# Altium footprint library XTIDA-010086.PcbLib: 88 footprints (part 5 of 6)
Each footprint in its own frame and in the unit in brackets; x right, y up, seen from the top. Pads: shape width x height; smd on the part's side, far side on the other; paste and mask are expansions set on the pad; w line width, h text height; cw(c..) or ccw(c..) is an arc to the next point about the centre after c.
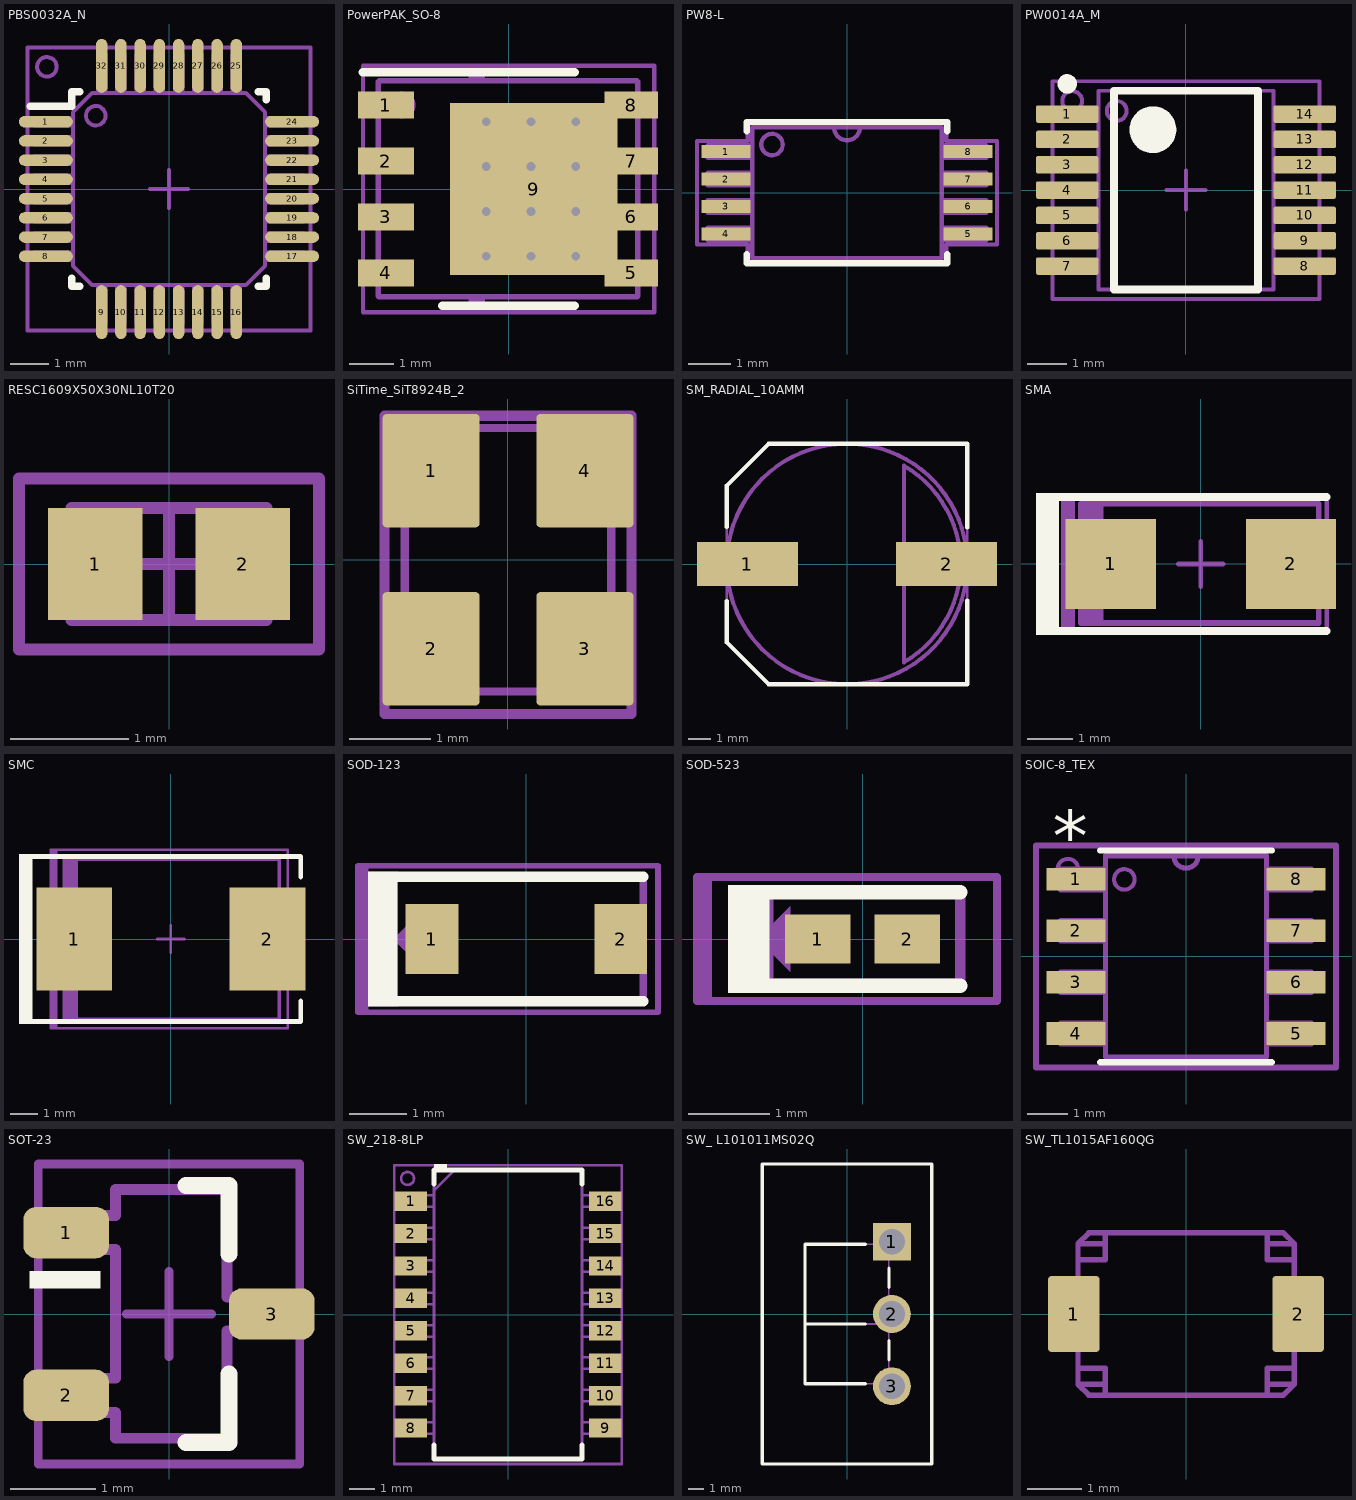
[diagram p4: the footprints below, top view; thin cyan lines are the x and y axes]

## PBS0032A_N [mm]
height 1.2
pads (32):
  oval 1.4x0.3 smd: 1(-3.2,1.75) 2(-3.2,1.25) 3(-3.2,0.75) 4(-3.2,0.25) 5(-3.2,-0.25) 6(-3.2,-0.75) 7(-3.2,-1.25) 8(-3.2,-1.75) 17(3.2,-1.75) 18(3.2,-1.25) 19(3.2,-0.75) 20(3.2,-0.25) 21(3.2,0.25) 22(3.2,0.75) 23(3.2,1.25) 24(3.2,1.75)
  oval 0.3x1.4 smd: 9(-1.75,-3.2) 10(-1.25,-3.2) 11(-0.75,-3.2) 12(-0.25,-3.2) 13(0.25,-3.2) 14(0.75,-3.2) 15(1.25,-3.2) 16(1.75,-3.2) 25(1.75,3.2) 26(1.25,3.2) 27(0.75,3.2) 28(0.25,3.2) 29(-0.25,3.2) 30(-0.75,3.2) 31(-1.25,3.2) 32(-1.75,3.2)
Top Overlay:
  lines w0.2: -3.6,2.15 -2.527,2.15 -2.527,2.527 -2.327,2.527 ; -2.527,-2.327 -2.527,-2.527 -2.327,-2.527 ; 2.327,-2.527 2.527,-2.527 2.527,-2.327 ; 2.327,2.527 2.527,2.527 2.527,2.327
Mechanical 5:
  circle w0.102: c-3.175,3.175 r0.254
  lines w0.102: -3.683,-3.683 -3.683,3.683 3.683,3.683 3.683,-3.683 -3.683,-3.683
  text ".Designator" at -3.76,-0.238 h0.75
Mechanical 13:
  drawing of 417 lines, arcs and shapes, not listed
Mechanical 15:
  lines w0.1: -0.5,0 0.5,0 ; 0,-0.5 0,0.5
3D body "PBS0032A.stp": height 1.12, standoff 0.03, extent -3.5,-3.5 3.5,3.5

## PowerPAK_SO-8 [mil] "Vishay PowerPAK SO-8, Body 5.3x6.0mm (max), Pitch 1.27mm, IPC Medium Density"
height 44.09
pads (9):
  rect 50x24 smd mask+2.99: 1(-109.5,75) 2(-109.5,25) 3(-109.5,-25) 4(-109.5,-75)
  rect 48x24 smd mask+2.99: 5(109.5,-75) 8(109.5,75)
  rect 48x24 smd paste-12 mask+2.99: 6(109.5,-25) 7(109.5,25)
  rect 150x154 smd paste-75 mask+2.99: 9(22.5,0)
via 60,-60 diameter 19.68 hole 7.87
via 20,-60 diameter 19.68 hole 7.87
via -20,-60 diameter 19.68 hole 7.87
via 60,-20 diameter 19.68 hole 7.87
via 20,-20 diameter 19.68 hole 7.87
via -20,-20 diameter 19.68 hole 7.87
via 60,20 diameter 19.68 hole 7.87
via 20,20 diameter 19.68 hole 7.87
via -20,20 diameter 19.68 hole 7.87
via 60,60 diameter 19.68 hole 7.87
via 20,60 diameter 19.68 hole 7.87
via -20,60 diameter 19.68 hole 7.87
Top Overlay:
  lines w7.87: -129.92,104.33 59.06,104.33 ; -59.06,-104.33 59.06,-104.33
Top Paste:
  rectangle: 97.5,-37 133,-13
  rectangle: 97.5,13 133,37
  rectangle: 25,-72 92.5,-2.5
  rectangle: 25.5,2.5 93,72
  rectangle: -47,2.5 20.5,72
  rectangle: -47.5,-72 20,-2.5
Mechanical 5:
  circle w4: c-95,75 r10
  lines w3.94: -130,-110 130,-110 130,110 -130,110 -130,-110
  text ".Designator" at -148.02,-9.38 h29.53
Mechanical 13:
  circle w4: c-95,75 r10
  lines w5: -116.46,-95.39 -115.48,-96.38 -115.46,-96.38 -33.46,-96.38 ; -116.46,-95.39 -116.46,-95.38 ; -116.46,-95.38 -116.46,-80.88 ; -116.46,-80.88 -121.46,-80.88 -121.46,-68.88 -116.46,-68.88 ; -116.46,-80.88 -116.46,-68.88 ; -116.46,-68.88 -116.46,-30.88 ; -116.46,-30.88 -121.46,-30.88 -121.46,-18.88 -116.46,-18.88 ; -116.46,-30.88 -116.46,-18.88 ; -116.46,-18.88 -116.46,19.12 ; -116.46,19.12 -116.46,31.12 ; -116.46,19.12 -121.46,19.12 -121.46,31.12 -116.46,31.12 ; -116.46,31.12 -116.46,69.12 ; -116.46,69.12 -121.46,69.12 -121.46,81.12 -116.46,81.12 ; -116.46,69.12 -116.46,81.12 ; -116.46,81.12 -116.46,95.62 -116.46,95.64 -115.48,96.62 -115.46,96.62 -33.46,96.62 ; -33.46,-96.38 -23.46,-96.38 ; -33.46,-96.38 -33.46,-101.38 -23.46,-101.38 -23.46,-96.38 ; -33.46,96.62 -23.46,96.62 ; -33.46,96.62 -33.46,101.62 -23.46,101.62 -23.46,96.62 ; -23.46,-96.38 114.54,-96.38 ; -23.46,96.62 114.54,96.62 ; 114.55,-96.38 115.54,-95.39 ; 114.54,-96.38 114.55,-96.38 ; 114.54,96.62 114.55,96.62 ; 114.55,96.62 115.54,95.64 115.54,95.62 115.54,81.12 ; 115.54,-95.38 115.54,-80.88 ; 115.54,-95.39 115.54,-95.38 ; 115.54,-80.88 115.54,-68.88 ; 115.54,-80.88 120.54,-80.88 120.54,-68.88 115.54,-68.88 ; 115.54,-68.88 115.54,-30.88 ; 115.54,-30.88 120.54,-30.88 120.54,-18.88 115.54,-18.88 ; 115.54,-30.88 115.54,-18.88 ; 115.54,-18.88 115.54,19.12 ; 115.54,19.12 115.54,31.12 ; 115.54,19.12 120.54,19.12 120.54,31.12 115.54,31.12 ; 115.54,31.12 115.54,69.12 ; 115.54,69.12 115.54,81.12 ; 115.54,69.12 120.54,69.12 120.54,81.12 115.54,81.12
Mechanical 15:
  lines w3.94: -19.68,0 19.68,0 ; 0,-19.68 0,19.68
3D body "PPAKSO8-SINGLE.stp": height 42.6, standoff 0.6, extent -120.84,-101.5 121.16,101.5

## PW8-L [mil]
pads (8):
  rect 46x12 smd paste+0 mask+0: 1(-113,38.39) 2(-113,12.8) 3(-113,-12.8) 4(-113,-38.39) 5(113,-38.39) 6(113,-12.8) 7(113,12.8) 8(113,38.39)
Top Overlay:
  lines w6: -93.5,-57.49 -93.5,-66 93.5,-66 93.5,-57.49 ; -93.5,57.49 -93.5,66 93.5,66 93.5,57.49
  text "." at -120,75 h50
Mechanical 5:
  circle w4: c-70,45 r10
  lines w4: -140,-48.39 -92.5,-48.39 -92.5,-65 92.5,-65 92.5,-48.39 140,-48.39 140,48.39 92.5,48.39 92.5,65 -92.5,65 -92.5,48.39 -140,48.39 -140,-48.39
  text ".Designator" at -118.5,-7.41 h23.62
Mechanical 13:
  circle w4: c-70,45 r10
  lines w4: -12,61 ccw(c0,61) 12,61 ; -130,-44.39 -88.5,-44.39 -88.5,-32.39 -130,-32.39 -130,-44.39 ; -130,-18.8 -130,-6.8 -88.5,-6.8 -88.5,-18.8 -130,-18.8 ; -130,6.8 -88.5,6.8 -88.5,18.8 -130,18.8 -130,6.8 ; -130,32.39 -88.5,32.39 -88.5,44.39 -130,44.39 -130,32.39 ; -88.5,-61 88.5,-61 88.5,61 -88.5,61 -88.5,-61 ; 88.5,-44.39 130,-44.39 130,-32.39 88.5,-32.39 88.5,-44.39 ; 88.5,-18.8 130,-18.8 130,-6.8 88.5,-6.8 88.5,-18.8 ; 88.5,6.8 130,6.8 130,18.8 88.5,18.8 88.5,6.8 ; 88.5,32.39 130,32.39 130,44.39 88.5,44.39 88.5,32.39
3D body "PW0008A.stp": height 42.32, standoff -0.98, extent -126.39,-59.05 126.4,59.06

## PW0014A_M [mm] "SOP, 14-Leads, Body 5.1x4.5mm, Pitch 0.65mm, IPC Low Density"
height 1.2
pads (14):
  rrect22% 1.6x0.45 smd: 1(-3.05,1.95) 2(-3.05,1.3) 3(-3.05,0.65) 4(-3.05,0) 5(-3.05,-0.65) 6(-3.05,-1.3) 7(-3.05,-1.95) 8(3.05,-1.95) 9(3.05,-1.3) 10(3.05,-0.65) 11(3.05,0) 12(3.05,0.65) 13(3.05,1.3) 14(3.05,1.95)
Top Overlay:
  circle w0.6: c-0.85,1.55 r0.3
  circle w0.25: c-3.05,2.725 r0.125
  lines w0.2: -1.85,-2.55 1.85,-2.55 1.85,2.55 -1.85,2.55 -1.85,-2.55
Mechanical 5:
  circle w0.102: c-2.921,2.286 r0.254
  lines w0.102: -3.429,-2.794 3.429,-2.794 3.429,2.794 -3.429,2.794 -3.429,-2.794
  text ".Designator" at -3.76,-0.238 h0.75
Mechanical 13:
  circle w0.102: c-1.778,2.032 r0.254
  lines w0.1: -2.25,-2.55 2.25,-2.55 2.25,2.55 -2.25,2.55 -2.25,-2.55
Mechanical 15:
  lines w0.1: -0.5,0 0.5,0 ; 0,-0.5 0,0.5
3D body "PW0014AakaMTC14.stp": height 1, standoff 0, extent -3.21,-2.5 3.21,2.5

## RESC1609X50X30NL10T20 [mm] "Chip Resistor, 2-Leads, Body 1.55x0.85mm, IPC Medium Density"
height 0.5
pads (2):
  rect 0.8x0.95 smd: 1(-0.625,0) 2(0.625,0)
Mechanical 5:
  lines w0.1: -1.27,-0.725 -1.27,0.725 1.27,0.725 1.27,-0.725 -1.27,-0.725
  text ".Designator" at -2.249,-0.15 h0.45
Mechanical 13:
  lines w0.1: -0.825,-0.475 0.825,-0.475 0.825,0.475 -0.825,0.475 -0.825,-0.475
Mechanical 15:
  lines w0.1: -0.475,0 0.475,0 ; 0,-0.475 0,0.475
3D body: height 0.5, standoff 0, extent -0.525,-0.475 0.525,0.475
3D body: height 0.5, standoff 0, extent 0.525,-0.475 0.825,0.475
3D body: height 0.5, standoff 0, extent -0.825,-0.475 -0.525,0.475

## SiTime_SiT8924B_2 [mm] "SMD, 4-Leads, Body 3.2x2.5mm"
height 0.8
pads (4):
  rrect8% 1.2x1.4 smd: 1(-0.95,1.1) 2(-0.95,-1.1) 3(0.95,-1.1) 4(0.95,1.1)
Mechanical 5:
  circle w0.1: c-0.7,1 r0.224
  lines w0.127: -1.524,-1.905 1.524,-1.905 1.524,1.778 -1.524,1.778 -1.524,-1.905
  text ".Designator" at -2.249,-0.15 h0.45
Mechanical 13:
  lines w0.1: -1.275,-1.625 -1.275,1.625 1.275,1.625 1.275,-1.625 -1.275,-1.625
3D body: height 0.8, standoff 0.8, extent -0.923,0.777 -0.477,1.223
3D body: height 0.8, standoff 0, extent -1.274,-1.624 1.274,1.624

## SM_RADIAL_10AMM [mm] "10 x 7.9mm:  Sanyo Oscon F8"
height 8
pads (2):
  rect 4.4x1.9 smd: 1(-4.35,0) 2(4.35,0)
Top Overlay:
  lines w0.178: -5.25,-1.624 -5.25,-3.425 -3.425,-5.25 5.25,-5.25 5.25,-1.597 ; -5.25,1.624 -5.25,3.425 -3.425,5.25 5.25,5.25 5.25,1.597
Mechanical 5:
  lines w0.127: -5.25,-3.425 -3.425,-5.25 5.25,-5.25 5.25,-1.597 5.25,1.597 5.25,5.25 -3.425,5.25 -5.25,3.425 -5.25,1.624 -5.25,-1.624 -5.25,-3.425
  text ".Designator" at -4.998,-0.333 h1
Mechanical 13:
  circle w0.178: c0,0 r5.25
  lines w0.178: 2.48,-4.296 ccw(c0,0) 2.48,4.296 2.48,-4.296
3D body: height 1, standoff 0, extent -5.251,-5.251 5.251,5.251
3D body: height 8, standoff 1, extent -5.249,-5.249 5.249,5.249
3D body: height 8, standoff 8, extent 2.48,-4.296 4.961,4.296

## SMA [mm] "Molded Diode, 2-Leads, Body 4.3x2.6mm, IPC Medium Density, based on OnSemi component dimensions and land pattern"
height 2.27
pads (2):
  rect 2x2 smd: 1(-2,0) 2(2,0)
Top Overlay:
  rectangle: -3.658,-1.575 -3.15,1.575
  lines w0.178: -3.327,-1.486 2.794,-1.486 ; -3.327,1.486 2.794,1.486
Mechanical 5:
  rectangle: -3.048,-1.524 -2.794,1.524
  region: -2.286,-0.4 -2.286,0.4 -2.686,0
  lines w0.1: -3.048,-1.516 2.794,-1.516 2.794,1.524 -3.048,1.524 -3.048,-1.516
  text ".Designator" at -2.999,-0.2 h0.6
Mechanical 13:
  rectangle: -2.667,-1.335 -2.159,1.368
  lines w0.127: -2.667,-1.31 -2.667,1.338 2.617,1.338 2.617,-1.31 -2.667,-1.31
Mechanical 15:
  lines w0.1: -0.5,0 0.5,0 ; 0,-0.5 0,0.5
3D body "SMA_nominal.stp": height 2.42, standoff 0.02, extent -2.6,-1.3 2.6,1.3

## SMC [mil] "Molded Diode, 2-Leads, Body 6.9x5.8mm, IPC Medium Density, based on OnSemi component dimensions and land patterns"
height 94.88
pads (2):
  rect 110x150 smd: 1(-140.49,0) 2(140.49,0)
Top Overlay:
  rectangle: -221,-123.5 -201,123.5
  lines w7: -210,-120 189,-120 189,-90.25 ; -210,120 189,120 189,90.25
Mechanical 5:
  rectangle: -175,-129.92 -165,130
  region: -139.25,-15.92 -139.25,15.57 -155,-0.17
  lines w3.94: -175,-129.92 -175,129.92 170,129.92 170,-129.92 -175,-129.92
  text ".Designator" at -147.59,-9.84 h29.53
Mechanical 13:
  rectangle: -155,-116.52 -135,115
  lines w5: -155,-116.56 157.72,-116.56 157.72,116.17 -155,116.17 -155,-116.52
Mechanical 15:
  lines w3.94: -19.69,0 19.68,0 ; 0,-19.68 0,19.68
3D body "SMC_nominal.stp": height 91.35, standoff 0.6, extent -156.49,-116.13 156.5,116.15

## SOD-123 [mm] "On Semi recommended land pattern"
height 1.35
pads (2):
  rect 0.915x1.22 smd: 1(-1.637,0) 2(1.637,0)
Top Overlay:
  rectangle: -2.744,-1.168 -2.236,1.168
  lines w0.178: -2.413,-1.079 2.032,-1.079 ; -2.413,1.079 2.032,1.079
Mechanical 5:
  rectangle: -2.921,-1.27 -2.737,1.27
  region: -1.905,-0.4 -1.905,0.4 -2.305,0
  lines w0.1: -2.921,-1.27 2.286,-1.27 2.286,1.27 -2.921,1.27 -2.921,-1.27
  text ".Designator" at -2.999,-0.2 h0.6
Mechanical 13:
  rectangle: -2.744,-1.168 -2.236,1.168
  lines w0.127: -2.413,-1.079 2.032,-1.079 2.032,1.079 -2.413,1.079
3D body "SOD-123.stp": height 1.35, standoff 0, extent -1.932,-0.9 1.932,0.9

## SOD-523 [mm] "NXP Semiconductor recommended land pattern, nominal STEP model"
height 0.7
pads (2):
  rect 0.8x0.6 smd paste-0.05: 1(-0.55,0) 2(0.55,0)
Top Overlay:
  rectangle: -1.651,-0.661 -1.143,0.66
  lines w0.178: -1.475,-0.572 0,-0.572 1.2,-0.572 ; -1.475,0.572 0,0.572 1.2,0.572
Mechanical 5:
  rectangle: -2.032,-0.762 -1.848,0.762
  region: -0.889,-0.4 -0.889,0.4 -1.289,0
  lines w0.1: -2.032,-0.762 -2.032,0.762 1.651,0.762 1.651,-0.762 -2.032,-0.762
  text ".Designator" at -2.249,-0.15 h0.45
Mechanical 13:
  rectangle: -1.6,-0.635 -1.092,0.635
  lines w0.127: -1.475,-0.546 0,-0.546 1.2,-0.546 1.2,0.546 0,0.559 -1.475,0.559
3D body "SOD-523F.stp": height 0.72, standoff 0.02, extent -0.8,-0.399 0.8,0.399

## SOIC-8_TEX [mil]
height 23.62
pads (8):
  rect 57.5x22 smd paste+0 mask+0: 1(-107.25,75) 2(-107.25,25) 3(-107.25,-25) 4(-107.25,-75) 5(107.25,-75) 6(107.25,-25) 7(107.25,25) 8(107.25,75)
Top Overlay:
  lines w6: -83.5,-103 83.5,-103 ; -83.5,103 83.5,103
  text "*" at -129.75,92 h50
Mechanical 5:
  circle w4: c-115,85 r10
  lines w6: -146,-108 -88.5,-108 88.5,-108 146,-108 146,108 88.5,108 -88.5,108 -146,108 -146,-108
  text ".Designator" at -9.84,147.59 h29.53
Mechanical 13:
  circle w4: c-60,75 r10
  lines w5: -12,98 ccw(c0,98) 12,98 ; -122,-85 -122,-65 -78.5,-65 -78.5,-85 -122,-85 ; -122,-35 -122,-15 -78.5,-15 -78.5,-35 -122,-35 ; -122,15 -78.5,15 -78.5,35 -122,35 -122,15 ; -122,65 -122,85 -78.5,85 -78.5,65 -122,65 ; -78.5,-98 78.5,-98 78.5,98 -78.5,98 -78.5,-98 ; 78.5,-85 78.5,-65 122,-65 122,-85 78.5,-85 ; 78.5,-35 78.5,-15 122,-15 122,-35 78.5,-35 ; 78.5,15 122,15 122,35 78.5,35 78.5,15 ; 78.5,65 122,65 122,85 78.5,85 78.5,65

## SOT-23 [mm] "SOT23, 3-Leads, Body 2.9x1.3mm, Pitch 0.95mm, Lead Span 2.5mm, IPC Medium Density"
height 1.1
pads (3):
  rrect50% 1x0.6 smd: 1(-1.2,0.95) 2(-1.2,-0.95) 3(1.2,0)
Top Overlay:
  rectangle: -1.625,0.3 -0.8,0.5
  lines w0.2: 0.2,-1.5 0.7,-1.5 0.7,-0.7 ; 0.2,1.5 0.7,1.5 0.7,0.7
Mechanical 5:
  lines w0.102: -1.524,-1.75 1.524,-1.75 1.524,1.75 -1.524,1.75 -1.524,-1.75
  text ".Designator" at -0.15,2.249 h0.45
Mechanical 13:
  lines w0.127: -1.16,-1.15 -0.625,-1.15 -0.625,-1.45 0.675,-1.45 0.675,-0.2 1.21,-0.2 1.21,0.2 0.675,0.2 0.675,1.45 -0.625,1.45 -0.625,1.15 -1.16,1.15 -1.16,0.75 -0.625,0.75 -0.625,-0.75 -1.16,-0.75 -1.16,-1.15
Mechanical 15:
  lines w0.1: -0.5,0 0.5,0 ; 0,-0.5 0,0.5
3D body "SW3dPS-sot-3p290x130ll237h100.STEP": height 1, standoff 0, extent -1.16,-1.45 1.21,1.45

## SW_218-8LP [mm] "SMD, 16-Leads, Body 11.33x5.8mm, Pitch 1.27mm"
height 2.65
pads (16):
  rect 1.27x0.76 smd: 1(-3.81,4.445) 2(-3.81,3.175) 3(-3.81,1.905) 4(-3.81,0.635) 5(-3.81,-0.635) 6(-3.81,-1.905) 7(-3.81,-3.175) 8(-3.81,-4.445) 9(3.81,-4.445) 10(3.81,-3.175) 11(3.81,-1.905) 12(3.81,-0.635) 13(3.81,0.635) 14(3.81,1.905) 15(3.81,3.175) 16(3.81,4.445)
Top Overlay:
  rectangle: -2.9,5.665 -2.4,5.9
  lines w0.2: -2.9,-5.12 -2.9,-5.665 2.9,-5.665 2.9,-5.12 ; -2.9,5.12 -2.9,5.665 2.9,5.665 2.9,5.12
Mechanical 5:
  circle w0.102: c-3.937,5.334 r0.254
  lines w0.102: -4.458,-5.855 4.458,-5.855 4.458,5.855 -4.458,5.855 -4.458,-5.855
  text ".Designator" at -0.333,4.998 h1
Mechanical 13:
  drawing of 249 lines, arcs and shapes, not listed
  text "1" at -2.069,4.445 h0.46
3D body: height 2.62, standoff 0, extent -4.22,-5.665 4.22,5.665

## SW_ L101011MS02Q [mm] "SWITCH SLIDE sPST 4A PCB"
height 14.18
pads (3):
  rect 2.416x2.416 hole 1.65: 1(2.857,4.6)
  round 2.416 hole 1.65: 2(2.857,0) 3(2.857,-4.6)
Top Overlay:
  lines w0.2: -5.405,9.55 5.395,9.55 5.395,-9.55 ; -5.395,9.55 -5.395,-9.55 5.405,-9.55 ; -2.668,-0.635 1.166,-0.635 ; 1.166,-4.445 -2.668,-4.445 -2.668,4.445 1.166,4.445 ; 2.668,-2.911 2.668,-1.689 ; 2.668,1.689 2.668,2.911
Mechanical 5:
  lines w0.1: -2.668,-0.635 -2.668,-4.445 2.668,-4.445 2.668,-0.635 ; -2.668,-0.635 -2.668,4.445 2.668,4.445 2.668,-0.635 ; -2.668,-0.635 2.668,-0.635 ; -5.395,-9.55 -5.395,9.55 5.395,9.55 5.395,-9.55 -5.395,-9.55
  text ".Designator" at -0.333,4.998 h1
3D body: height 9.1, standoff 0, extent -5.394,-9.549 5.394,9.549
3D body: height 14.18, standoff 9.1, extent -2.668,-0.635 2.668,4.445

## SW_TL1015AF160QG [mm] "E-Switch"
height 2.25
pads (2):
  rrect11% 0.95x1.4 smd: 1(-2.075,0) 2(2.075,0)
Mechanical 5:
  lines w0.1: -1.997,-0.5 -2.013,-0.5 -2.102,-0.5 ; -1.997,0.5 -2.013,0.5 -2.102,0.5 ; 2.003,-0.5 2.019,-0.5 2.107,-0.5 ; 2.003,0.5 2.019,0.5 2.107,0.5 ; -2.102,-0.5 -2.3,-0.5 -2.3,0.5 -2.102,0.5 ; -2.102,-0.5 -2.102,0.5 ; -1.997,-1.3 -1.997,-1 ; -1.997,-1.3 -1.797,-1.5 -1.497,-1.5 ; -1.997,-1.3 -1.497,-1.3 ; -1.997,-1 -1.497,-1 ; -1.997,-1 -1.497,-1 ; -1.997,-1 -1.997,1 ; -1.997,1 -1.497,1 ; -1.997,1 -1.997,1.3 ; -1.997,1 -1.497,1 ; -1.997,1.3 -1.497,1.3 ; -1.997,1.3 -1.797,1.5 -1.497,1.5 ; -1.497,-1.5 1.503,-1.5 ; -1.497,-1.5 -1.497,-1.3 ; -1.497,-1.3 -1.497,-1 ; -1.497,-1.3 -1.497,-1 ; -1.497,1 -1.497,1.3 ; -1.497,1 -1.497,1.3 ; -1.497,1.3 -1.497,1.5 ; -1.497,1.5 1.503,1.5 ; 1.503,-1.5 1.803,-1.5 2.003,-1.3 ; 1.503,-1.5 1.503,-1.3 ; 1.503,-1.3 2.003,-1.3 ; 1.503,-1.3 1.503,-1 ; 1.503,-1.3 1.503,-1 ; 1.503,-1 2.003,-1 ; 1.503,-1 2.003,-1 ; 1.503,1 1.503,1.3 ; 1.503,1 2.003,1 ; 1.503,1 1.503,1.3 ; 1.503,1 2.003,1 ; 1.503,1.3 2.003,1.3 ; 1.503,1.3 1.503,1.5 ; 1.503,1.5 1.803,1.5 2.003,1.3 ; 2.003,-1.3 2.003,-1 ; 2.003,-1 2.003,1 ; 2.003,1 2.003,1.3 ; 2.107,-0.5 2.107,0.5 ; 2.107,-0.5 2.306,-0.5 2.306,0.5 2.107,0.5
  text ".Designator" at -2.249,-0.15 h0.45
3D body "ESwitch_TL1015AF160QG.stp": height 2, standoff 0, extent -2.303,-1.5 2.303,1.5